# Altium integrated library all_in_one_library.IntLib: 677 symbols (part 3 of 3) (continued)
## RES_330k_5%_0805 (continued)
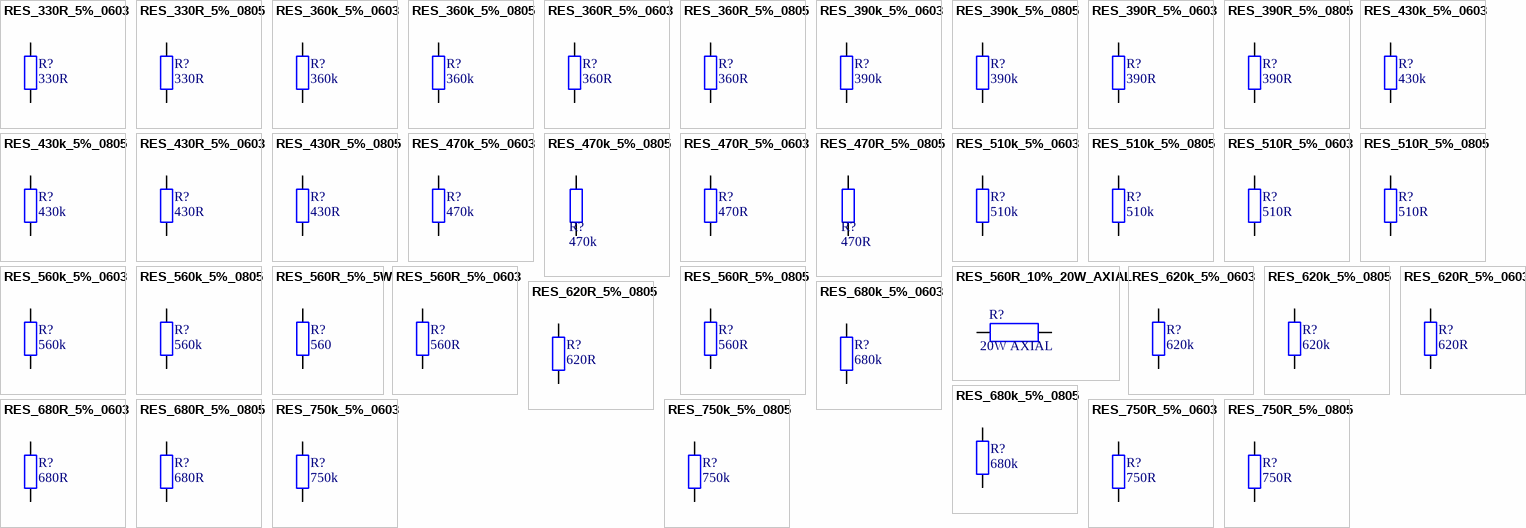
[diagram p15: symbols RES_330R_5%_0603 to RES_750R_5%_0805]

## RES_330R_5%_0603
designator R?, comment value 330R  (hidden comment: Thick film)
330.00; Tolerance [%]: ±5; Power Rating [W]: 0.1; Case [EIA]: 0603; Case [Metric]: 1608; Value [Ω]: 330.00
footprint RES_0603
pins: 1, 2
1 alternate drawing of the same symbol

## RES_330R_5%_0805
designator R?, comment value 330R  (hidden comment: Thick film)
330.00; Tolerance [%]: ±5; Power Rating [W]: 0.1; Case [EIA]: 0805; Case [Metric]: 2012; Value [Ω]: 330.00
footprint RES_0805
pins: 1, 2
1 alternate drawing of the same symbol

## RES_360k_5%_0603
designator R?, comment value 360k  (hidden comment: Thick film)
360000.00; Tolerance [%]: ±5; Power Rating [W]: 0.1; Case [EIA]: 0603; Case [Metric]: 1608; Value [Ω]: 360000.00
footprint RES_0603
pins: 1, 2
1 alternate drawing of the same symbol

## RES_360k_5%_0805
designator R?, comment value 360k  (hidden comment: Thick film)
360000.00; Tolerance [%]: ±5; Power Rating [W]: 0.1; Case [EIA]: 0805; Case [Metric]: 2012; Value [Ω]: 360000.00
footprint RES_0805
pins: 1, 2
1 alternate drawing of the same symbol

## RES_360R_5%_0603
designator R?, comment value 360R  (hidden comment: Thick film)
360.00; Tolerance [%]: ±5; Power Rating [W]: 0.1; Case [EIA]: 0603; Case [Metric]: 1608; Value [Ω]: 360.00
footprint RES_0603
pins: 1, 2
1 alternate drawing of the same symbol

## RES_360R_5%_0805
designator R?, comment value 360R  (hidden comment: Thick film)
360.00; Tolerance [%]: ±5; Power Rating [W]: 0.1; Case [EIA]: 0805; Case [Metric]: 2012; Value [Ω]: 360.00
footprint RES_0805
pins: 1, 2
1 alternate drawing of the same symbol

## RES_390k_5%_0603
designator R?, comment value 390k  (hidden comment: Thick film)
390000.00; Tolerance [%]: ±5; Power Rating [W]: 0.1; Case [EIA]: 0603; Case [Metric]: 1608; Value [Ω]: 390000.00
footprint RES_0603
pins: 1, 2
1 alternate drawing of the same symbol

## RES_390k_5%_0805
designator R?, comment value 390k  (hidden comment: Thick film)
390000.00; Tolerance [%]: ±5; Power Rating [W]: 0.1; Case [EIA]: 0805; Case [Metric]: 2012; Value [Ω]: 390000.00
footprint RES_0805
pins: 1, 2
1 alternate drawing of the same symbol

## RES_390R_5%_0603
designator R?, comment value 390R  (hidden comment: Thick film)
390.00; Tolerance [%]: ±5; Power Rating [W]: 0.1; Case [EIA]: 0603; Case [Metric]: 1608; Value [Ω]: 390.00
footprint RES_0603
pins: 1, 2
1 alternate drawing of the same symbol

## RES_390R_5%_0805
designator R?, comment value 390R  (hidden comment: Thick film)
390.00; Tolerance [%]: ±5; Power Rating [W]: 0.1; Case [EIA]: 0805; Case [Metric]: 2012; Value [Ω]: 390.00
footprint RES_0805
pins: 1, 2
1 alternate drawing of the same symbol

## RES_430k_5%_0603
designator R?, comment value 430k  (hidden comment: Thick film)
430000.00; Tolerance [%]: ±5; Power Rating [W]: 0.1; Case [EIA]: 0603; Case [Metric]: 1608; Value [Ω]: 430000.00
footprint RES_0603
pins: 1, 2
1 alternate drawing of the same symbol

## RES_430k_5%_0805
designator R?, comment value 430k  (hidden comment: Thick film)
430000.00; Tolerance [%]: ±5; Power Rating [W]: 0.1; Case [EIA]: 0805; Case [Metric]: 2012; Value [Ω]: 430000.00
footprint RES_0805
pins: 1, 2
1 alternate drawing of the same symbol

## RES_430R_5%_0603
designator R?, comment value 430R  (hidden comment: Thick film)
430.00; Tolerance [%]: ±5; Power Rating [W]: 0.1; Case [EIA]: 0603; Case [Metric]: 1608; Value [Ω]: 430.00
footprint RES_0603
pins: 1, 2
1 alternate drawing of the same symbol

## RES_430R_5%_0805
designator R?, comment value 430R  (hidden comment: Thick film)
430.00; Tolerance [%]: ±5; Power Rating [W]: 0.1; Case [EIA]: 0805; Case [Metric]: 2012; Value [Ω]: 430.00
footprint RES_0805
pins: 1, 2
1 alternate drawing of the same symbol

## RES_470k_5%_0603
designator R?, comment value 470k  (hidden comment: Thick film)
470000.00; Tolerance [%]: ±5; Power Rating [W]: 0.1; Case [EIA]: 0603; Case [Metric]: 1608; Value [Ω]: 470000.00
footprint RES_0603
pins: 1, 2
1 alternate drawing of the same symbol

## RES_470k_5%_0805
designator R?, comment value 470k  (hidden comment: Thick film)
470000.00; Tolerance [%]: ±5; Power Rating [W]: 0.1; Case [EIA]: 0805; Case [Metric]: 2012; Value [Ω]: 470000.00
footprint RES_0805
pins: 1, 2
1 alternate drawing of the same symbol

## RES_470R_5%_0603
designator R?, comment value 470R  (hidden comment: Thick film)
470.00; Tolerance [%]: ±5; Power Rating [W]: 0.1; Case [EIA]: 0603; Case [Metric]: 1608; Value [Ω]: 470.00
footprint RES_0603
pins: 1, 2
1 alternate drawing of the same symbol

## RES_470R_5%_0805
designator R?, comment value 470R  (hidden comment: Thick film)
470.00; Tolerance [%]: ±5; Power Rating [W]: 0.1; Case [EIA]: 0805; Case [Metric]: 2012; Value [Ω]: 470.00
footprint RES_0805
pins: 1, 2
1 alternate drawing of the same symbol

## RES_510k_5%_0603
designator R?, comment value 510k  (hidden comment: Thick film)
510000.00; Tolerance [%]: ±5; Power Rating [W]: 0.1; Case [EIA]: 0603; Case [Metric]: 1608; Value [Ω]: 510000.00
footprint RES_0603
pins: 1, 2
1 alternate drawing of the same symbol

## RES_510k_5%_0805
designator R?, comment value 510k  (hidden comment: Thick film)
510000.00; Tolerance [%]: ±5; Power Rating [W]: 0.1; Case [EIA]: 0805; Case [Metric]: 2012; Value [Ω]: 510000.00
footprint RES_0805
pins: 1, 2
1 alternate drawing of the same symbol

## RES_510R_5%_0603
designator R?, comment value 510R  (hidden comment: Thick film)
510.00; Tolerance [%]: ±5; Power Rating [W]: 0.1; Case [EIA]: 0603; Case [Metric]: 1608; Value [Ω]: 510.00
footprint RES_0603
pins: 1, 2
1 alternate drawing of the same symbol

## RES_510R_5%_0805
designator R?, comment value 510R  (hidden comment: Thick film)
510.00; Tolerance [%]: ±5; Power Rating [W]: 0.1; Case [EIA]: 0805; Case [Metric]: 2012; Value [Ω]: 510.00
footprint RES_0805
pins: 1, 2
1 alternate drawing of the same symbol

## RES_560k_5%_0603
designator R?, comment value 560k  (hidden comment: Thick film)
560000.00; Tolerance [%]: ±5; Power Rating [W]: 0.1; Case [EIA]: 0603; Case [Metric]: 1608; Value [Ω]: 560000.00
footprint RES_0603
pins: 1, 2
1 alternate drawing of the same symbol

## RES_560k_5%_0805
designator R?, comment value 560k  (hidden comment: Thick film)
560000.00; Tolerance [%]: ±5; Power Rating [W]: 0.1; Case [EIA]: 0805; Case [Metric]: 2012; Value [Ω]: 560000.00
footprint RES_0805
pins: 1, 2
1 alternate drawing of the same symbol

## RES_560R_5%_5W
designator R?, comment value 560  (hidden comment: Metal oxid)
560; Value [Ω]: 560000.00; Power Rating [W]: 5; Case [EIA]: metaloxid
footprint RES SQP MO (standing metaloxid resistor)
pins: 1, 2
1 alternate drawing of the same symbol

## RES_560R_5%_0603
designator R?, comment value 560R  (hidden comment: Thick film)
560.00; Tolerance [%]: ±5; Power Rating [W]: 0.1; Case [EIA]: 0603; Case [Metric]: 1608; Value [Ω]: 560.00
footprint RES_0603
pins: 1, 2
1 alternate drawing of the same symbol

## RES_560R_5%_0805
designator R?, comment value 560R  (hidden comment: Thick film)
560.00; Tolerance [%]: ±5; Power Rating [W]: 0.1; Case [EIA]: 0805; Case [Metric]: 2012; Value [Ω]: 560.00
footprint RES_0805
pins: 1, 2
1 alternate drawing of the same symbol

## RES_560R_10%_20W_AXIAL
designator R?, comment 20W AXIAL
20W_AXIAL
footprint RES_AX20W
footprint RES_AX20W - standoffset
pins: 1, 2

## RES_620k_5%_0603
designator R?, comment value 620k  (hidden comment: Thick film)
620000.00; Tolerance [%]: ±5; Power Rating [W]: 0.1; Case [EIA]: 0603; Case [Metric]: 1608; Value [Ω]: 620000.00
footprint RES_0603
pins: 1, 2
1 alternate drawing of the same symbol

## RES_620k_5%_0805
designator R?, comment value 620k  (hidden comment: Thick film)
620000.00; Tolerance [%]: ±5; Power Rating [W]: 0.1; Case [EIA]: 0805; Case [Metric]: 2012; Value [Ω]: 620000.00
footprint RES_0805
pins: 1, 2
1 alternate drawing of the same symbol

## RES_620R_5%_0603
designator R?, comment value 620R  (hidden comment: Thick film)
620.00; Tolerance [%]: ±5; Power Rating [W]: 0.1; Case [EIA]: 0603; Case [Metric]: 1608; Value [Ω]: 620.00
footprint RES_0603
pins: 1, 2
1 alternate drawing of the same symbol

## RES_620R_5%_0805
designator R?, comment value 620R  (hidden comment: Thick film)
620.00; Tolerance [%]: ±5; Power Rating [W]: 0.1; Case [EIA]: 0805; Case [Metric]: 2012; Value [Ω]: 620.00
footprint RES_0805
pins: 1, 2
1 alternate drawing of the same symbol

## RES_680k_5%_0603
designator R?, comment value 680k  (hidden comment: Thick film)
680000.00; Tolerance [%]: ±5; Power Rating [W]: 0.1; Case [EIA]: 0603; Case [Metric]: 1608; Value [Ω]: 680000.00
footprint RES_0603
pins: 1, 2
1 alternate drawing of the same symbol

## RES_680k_5%_0805
designator R?, comment value 680k  (hidden comment: Thick film)
680000.00; Tolerance [%]: ±5; Power Rating [W]: 0.1; Case [EIA]: 0805; Case [Metric]: 2012; Value [Ω]: 680000.00
footprint RES_0805
pins: 1, 2
1 alternate drawing of the same symbol

## RES_680R_5%_0603
designator R?, comment value 680R  (hidden comment: Thick film)
680.00; Tolerance [%]: ±5; Power Rating [W]: 0.1; Case [EIA]: 0603; Case [Metric]: 1608; Value [Ω]: 680.00
footprint RES_0603
pins: 1, 2
1 alternate drawing of the same symbol

## RES_680R_5%_0805
designator R?, comment value 680R  (hidden comment: Thick film)
680.00; Tolerance [%]: ±5; Power Rating [W]: 0.1; Case [EIA]: 0805; Case [Metric]: 2012; Value [Ω]: 680.00
footprint RES_0805
pins: 1, 2
1 alternate drawing of the same symbol

## RES_750k_5%_0603
designator R?, comment value 750k  (hidden comment: Thick film)
750000.00; Tolerance [%]: ±5; Power Rating [W]: 0.1; Case [EIA]: 0603; Case [Metric]: 1608; Value [Ω]: 750000.00
footprint RES_0603
pins: 1, 2
1 alternate drawing of the same symbol

## RES_750k_5%_0805
designator R?, comment value 750k  (hidden comment: Thick film)
750000.00; Tolerance [%]: ±5; Power Rating [W]: 0.1; Case [EIA]: 0805; Case [Metric]: 2012; Value [Ω]: 750000.00
footprint RES_0805
pins: 1, 2
1 alternate drawing of the same symbol

## RES_750R_5%_0603
designator R?, comment value 750R  (hidden comment: Thick film)
750.00; Tolerance [%]: ±5; Power Rating [W]: 0.1; Case [EIA]: 0603; Case [Metric]: 1608; Value [Ω]: 750.00
footprint RES_0603
pins: 1, 2
1 alternate drawing of the same symbol

## RES_750R_5%_0805
designator R?, comment value 750R  (hidden comment: Thick film)
750.00; Tolerance [%]: ±5; Power Rating [W]: 0.1; Case [EIA]: 0805; Case [Metric]: 2012; Value [Ω]: 750.00
footprint RES_0805
pins: 1, 2
1 alternate drawing of the same symbol

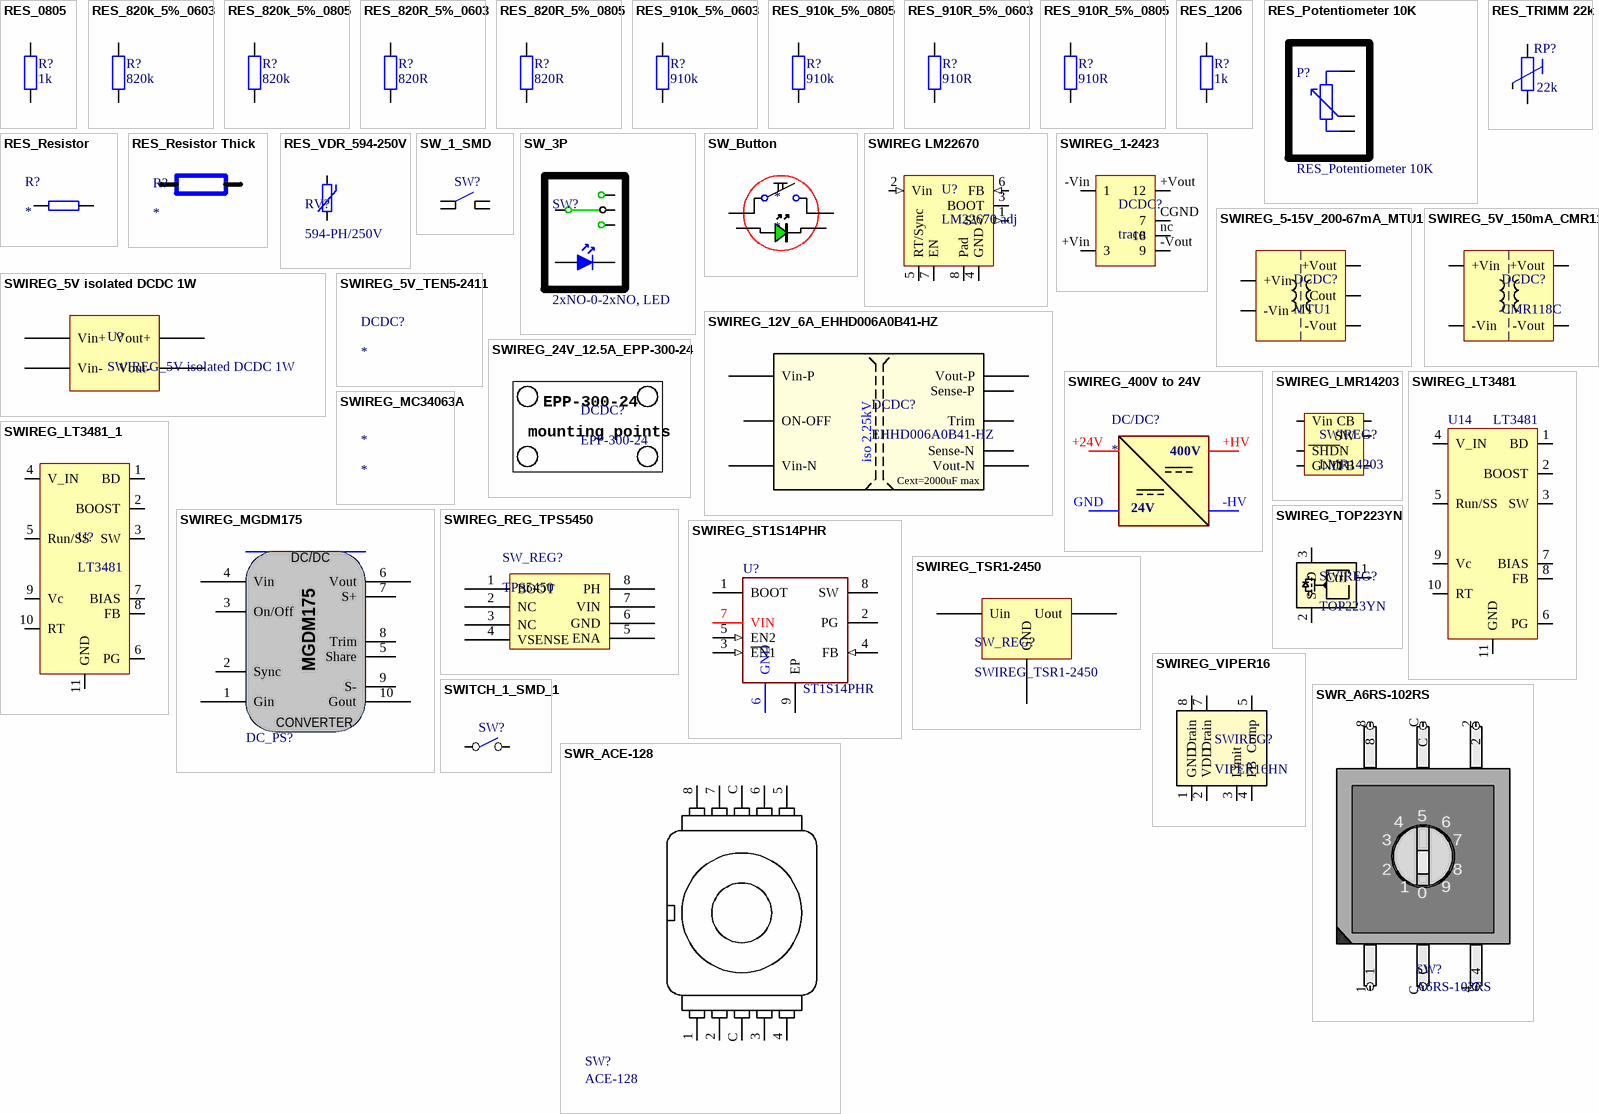
[diagram p16: symbols RES_0805 to SWR_ACE-128]

## RES_0805
designator R?, comment 1k
general resistor; Tolerance [%]: None; Power Rating [W]: 0.1; Case [EIA]: 1206; Case [Metric]: 3216; Value: 1k
footprint R0805
pins: 1, 2
1 alternate drawing of the same symbol

## RES_820k_5%_0603
designator R?, comment value 820k  (hidden comment: Thick film)
820000.00; Tolerance [%]: ±5; Power Rating [W]: 0.1; Case [EIA]: 0603; Case [Metric]: 1608; Value [Ω]: 820000.00
footprint RES_0603
pins: 1, 2
1 alternate drawing of the same symbol

## RES_820k_5%_0805
designator R?, comment value 820k  (hidden comment: Thick film)
820000.00; Tolerance [%]: ±5; Power Rating [W]: 0.1; Case [EIA]: 0805; Case [Metric]: 2012; Value [Ω]: 820000.00
footprint RES_0805
pins: 1, 2
1 alternate drawing of the same symbol

## RES_820R_5%_0603
designator R?, comment value 820R  (hidden comment: Thick film)
820.00; Tolerance [%]: ±5; Power Rating [W]: 0.1; Case [EIA]: 0603; Case [Metric]: 1608; Value [Ω]: 820.00
footprint RES_0603
pins: 1, 2
1 alternate drawing of the same symbol

## RES_820R_5%_0805
designator R?, comment value 820R  (hidden comment: Thick film)
820.00; Tolerance [%]: ±5; Power Rating [W]: 0.1; Case [EIA]: 0805; Case [Metric]: 2012; Value [Ω]: 820.00
footprint RES_0805
pins: 1, 2
1 alternate drawing of the same symbol

## RES_910k_5%_0603
designator R?, comment value 910k  (hidden comment: Thick film)
910000.00; Tolerance [%]: ±5; Power Rating [W]: 0.1; Case [EIA]: 0603; Case [Metric]: 1608; Value [Ω]: 910000.00
footprint RES_0603
pins: 1, 2
1 alternate drawing of the same symbol

## RES_910k_5%_0805
designator R?, comment value 910k  (hidden comment: Thick film)
910000.00; Tolerance [%]: ±5; Power Rating [W]: 0.1; Case [EIA]: 0805; Case [Metric]: 2012; Value [Ω]: 910000.00
footprint RES_0805
pins: 1, 2
1 alternate drawing of the same symbol

## RES_910R_5%_0603
designator R?, comment value 910R  (hidden comment: Thick film)
910.00; Tolerance [%]: ±5; Power Rating [W]: 0.1; Case [EIA]: 0603; Case [Metric]: 1608; Value [Ω]: 910.00
footprint RES_0603
pins: 1, 2
1 alternate drawing of the same symbol

## RES_910R_5%_0805
designator R?, comment value 910R  (hidden comment: Thick film)
910.00; Tolerance [%]: ±5; Power Rating [W]: 0.1; Case [EIA]: 0805; Case [Metric]: 2012; Value [Ω]: 910.00
footprint RES_0805
pins: 1, 2
1 alternate drawing of the same symbol

## RES_1206
designator R?, comment 1k
general resistor; Tolerance [%]: None; Power Rating [W]: 0.1; Case [EIA]: 1206; Case [Metric]: 3216; Value: 1k
footprint R1206
pins: 1, 2
1 alternate drawing of the same symbol

## RES_Potentiometer 10K
designator P?
Potentiometer 10K
pins: 1 POT1, 2 POT2, 3 POT3

## RES_Resistor
designator R?
pins: 1, 2

## RES_Resistor Thick
designator R?
pins: 1, 2

## RES_TRIMM 22k
designator RP?, comment 22k
BOURNS - 3296Y-1-223LF - TRIMMER, POT, 22KOHM, 10%, 25TURN, TH; Alias: BOURNS - 3296Y-1-223LF - TRIMMER 22k
footprint TRIMM 3296Y
pins: 1, 2, 3

## RES_VDR_594-250V
designator RV?, comment 594-PH/250V
varistor GME suplikove zasoby
footprint VAR_D7_E5 (roztec=5mm, priemer=8mm)
pins: 1, 2

## SW_1_SMD
designator SW?, comment Switch  (value not drawn)
TLACITKO_1
footprint SW_micro
pins: 1 COMMON, 2 COMMON, 3 NO, 4 NO

## SW_3P
designator SW?, comment 2xNO-0-2xNO, LED
pins: 1 NO11, 2 NO12, 3 NO13, 4 LED1, 5 LED2

## SW_Button
designator *
pins: 1, 2, 3, 4
1 alternate drawing of the same symbol

## SWIREG LM22670
designator U?, comment LM22670 adj
3A 4.2-42V stepdown switching regulator witch adjustable frequency; Suplier: Farnell; Alias: LM22670; Datasheet: http://www.farnell.com/datasheets/84969.pdf
footprint TO-263 (TJ7A)
pins: 1 SW (out), 2 Vin (in), 3 BOOT, 4 GND, 5 RT/Sync, 6 FB (in), 7 EN, 8 Pad

## SWIREG_1-2423
designator DCDC?, comment traco
24/+-15 tracopower
footprint TES 1-2423 (Traco 1W SMD)
pins: +Vin 3, +Vout 12, -Vin 1, -Vout 9, CGND 7, nc 18

## SWIREG_5-15V_200-67mA_MTU1
designator DCDC?, comment MTU1
Isolated 1W Single & Dual Output SM DC/DC Converter; Link: http://cz.farnell.com/webapp/wcs/stores/servlet/Search?st=MTU1&catalogId=15001&categoryId=700000004422&langId=420&storeId=10156
footprint MTU1_DCDC (murata iso power)
pins: +Vin, +Vout, -Vin, -Vout, Cout

## SWIREG_5V isolated DCDC 1W
designator U?
R1SE-0505; farnell: http://cz.farnell.com/recom-power/r1se-0505-r/dc-dc-converter-1x-o-p-0-2a-5v/dp/2218601
footprint R1SE-0505
pins: 1 Vin-, 2 Vin+, 4 Vout-, 5 Vout+

## SWIREG_5V_150mA_CMR118C
designator DCDC?, comment CMR118C
24V to 5V 150mA, 750 mW; Link: http://cz.farnell.com/murata-power-solutions/cmr118c/dc-dc-conv-iso-pol-1o-p-0-75w/dp/2400815
footprint DCDC_CMR118C (murata dcdc)
pins: +Vin, +Vout, -Vin, -Vout

## SWIREG_5V_TEN5-2411
designator DCDC?

## SWIREG_12V_6A_EHHD006A0B41-HZ
designator DCDC?, comment EHHD006A0B41-HZ
72W, 2kV isolated DCDC; link: http://cz.farnell.com/ge-critical-power/ehhd006a0b41-hz/dc-dc-12v-6a-1-8-brick-heat-plate/dp/2076849
footprint DCDC_1/8_Brick
pins: ON-OFF, S+ Sense-P, S- Sense-N, Trim, VI+ Vin-P, VI- Vin-N, Vo+ Vout-P, Vo- Vout-N
text: iso 2.25kV; Cext=2000uF max

## SWIREG_24V_12.5A_EPP-300-24
designator DCDC?, comment EPP-300-24
mounting parameters for EPP-300-24; link: http://goo.gl/zAbl2F
footprint EPP-300-24 (mounting for DCDC)
footprint EPP-300-24 - HP (High profile DCDC mounting)
footprint EPP-300-24 - LP (mounting for DCDC)
text: mounting points

## SWIREG_400V to 24V
designator DC/DC?
pins: +24V, +HV +400V, -HV +400V, GND +400V
text: 400V; 24V

## SWIREG_LMR14203
designator SWIREG?, comment LMR14203
SOT23-6 DC-DC BUCK 0.3A, 1.25MHZ; Link: http://cz.farnell.com/texas-instruments/lmr14203xmke-nopb/dc-dc-conv-buck-1-25mhz-sot-6/dp/2323516
footprint SOT23-6 (MAXIM package)
pins: 1 CB, 2 GND, 3 FB, 4 SHDN, 5 Vin, 6 SW

## SWIREG_LT3481
designator U14, comment LT3481
Swith step down
footprint LT-MSE-10 (for LT3481)
pins: 1 BD, 2 BOOST, 3 SW, 4 V_IN, 5 Run/SS, 6 PG, 7 BIAS, 8 FB, 9 Vc, 10 RT, 11 GND

## SWIREG_LT3481_1
designator U?, comment LT3481
Swith step down
pins: 1 BD, 2 BOOST, 3 SW, 4 V_IN, 5 Run/SS, 6 PG, 7 BIAS, 8 FB, 9 Vc, 10 RT, 11 GND

## SWIREG_MC34063A
designator *

## SWIREG_MGDM175
designator DC_PS?, comment CONVERTER  (value not drawn)
Hi-Rel DC/DC CONVERTER, 175W, Single output
footprint MGDM175
pins: 1 Gin, 2 Sync, 3 On/Off, 4 Vin, 5 Share, 6 Vout, 7 S+, 8 Trim, 9 S-, 10 Gout
text: DC/DC; MGDM175

## SWIREG_REG_TPS5450
designator SW_REG?, comment TPS5450
footprint TPS5450 - SO8_thermal (SOIC, 8-Leads, Body 4,90x3,90mm, Pitch 1,27mm, Thermal Pad 3,10x2,40mm, IPC Medium Density)
pins: 1 BOOT, 2 NC, 3 NC, 4 VSENSE, 5 ENA, 6 GND, 7 VIN, 8 PH

## SWIREG_ST1S14PHR
designator U?, comment ST1S14PHR
Up to 3 A step down switching regulator, 8-Pin HSOP; ComponentLink1Description: Manufacturer URL; PackageVersion: 2007; ComponentLink2URL: http://www.st.com/internet/com/TECHNICAL_RESOURCES/TECHNICAL_LITERATURE/DATASHEET/CD00285678.pdf; DatasheetVersion: Oct-2010; ComponentLink2Description: Datasheet; PackageReference: HSO-8; PackageDescription: 8-Pin Small Outline Integrated Circuit 1.27 mm Pitch; ComponentLink1URL: http://www.st.com
footprint SO8_Thermal
pins: 1 BOOT, 2 PG (oc), 3 ~{EN}1 (in), 4 FB (in), 5 EN2 (in), 6 GND (power), 7 VIN (power), 8 SW (power), 9 EP (power)

## SWIREG_TOP223YN
designator SWIREG?, comment TOP223YN
PWM SWITCH, TO-220-3; Link: http://www.tme.eu/cz/details/top223yn/stabilizator-napeti-obvody-dc-dc/power-integrations/#t73d087e2ca9b8c8ad0594216532a09b7
footprint TO220AB PWR
pins: 1 Ctrl, 2 S, 3 D

## SWIREG_TSR1-2450
designator SW_REG?
footprint TSR1 (Traco power)
pins: 1 Uin, 2 GND, 3 Uout

## SWIREG_VIPER16
designator SWIREG?, comment VIPER16HN
Fixed frequency VIPer; Link: http://cz.farnell.com/stmicroelectronics/viper16hn/ac-dc-converter-800v-115khz-7dip/dp/2311357
footprint DIP 8
pins: 1 GND, 2 VDD, 3 Limit, 4 FB, 5 Comp, 7 Drain, 8 Drain
1 alternate drawing of the same symbol

## SWITCH_1_SMD_1
designator SW?, comment Switch  (value not drawn)
TLACITKO_1
footprint SW_SMD
pins: 1 COMMON, 2 NO

## SWR_A6RS-102RS
designator SW?, comment A6RS-102RS
Omron Rotary DIP Switch
footprint SWR_A6RS-102RS (Omron Rotary DIP Switch)
pins: 1, 2, 4, 8, C, C
text: 5; 6; 3; 7; 9; 0

## SWR_ACE-128
designator SW?, comment ACE-128
footprint SWR_ACE-128
pins: 1, 2, 3, 4, 5, 6, 7, 8, C C , C C 

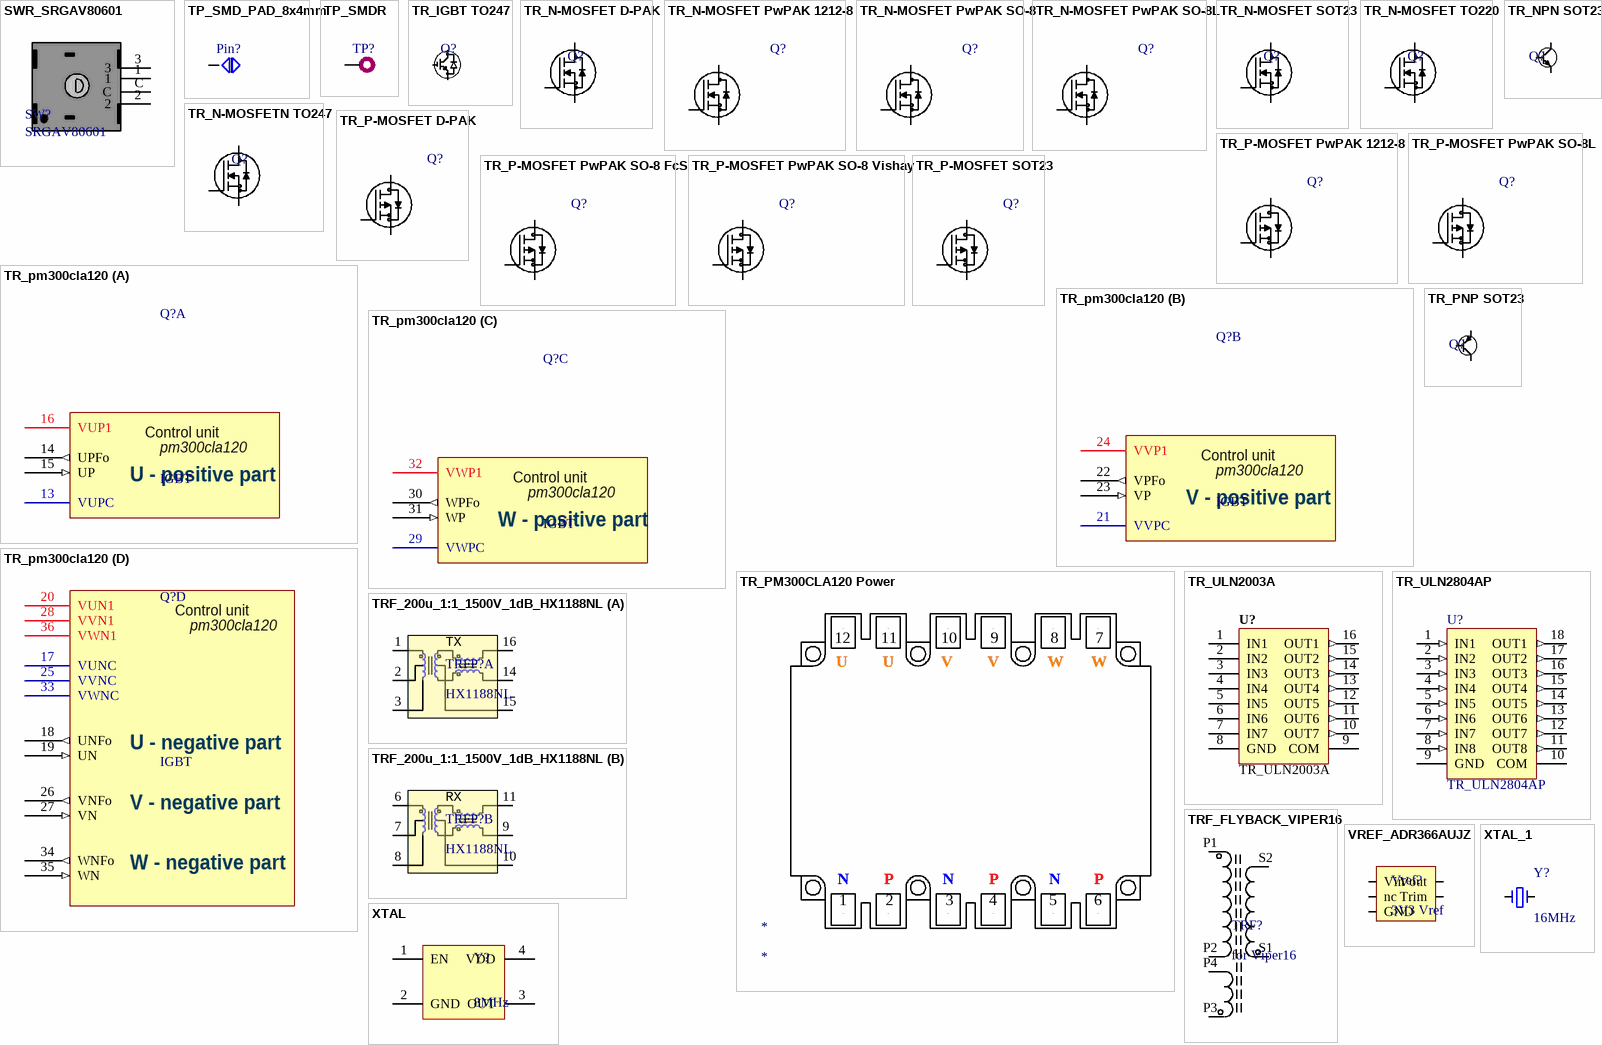
[diagram p17: symbols SWR_SRGAV80601 to XTAL_1]

## SWR_SRGAV80601
designator SW?, comment SRGAV80601
Hollow Shaft Encoder
footprint SWR_SRGAV80601 (Hollow Shaft Encoder)
pins: 1, 2, 3, C

## TP_SMD_PAD_8x4mm
designator Pin?, comment smd_pad  (value not drawn)
contact place for wire on pcb 8x4mm
footprint SMD_PAD_8_4_MM
pins: PIN

## TP_SMDR
designator TP?, comment TP-SMDR  (value not drawn)
smd round testpoint
footprint TP_ROUND (test-point)
pins: TP

## TR_IGBT TO247
designator Q?, comment igbt, diode  (value not drawn)
IGBT with diode tranzistor
footprint TO-247AC - Power (SIP with Mounting Hole; 3 Leads; Body 20 x 15.6 x 5 mm (typ); Pitch 5.45 mm)
pins: 1 G, 2 C, 3 E

## TR_N-MOSFET D-PAK
designator Q?, comment Nmos  (value not drawn)
TO252
footprint D-PAK
footprint D-PAK_HV (S-D higher isolation gap)
pins: 1 G, 2 S, 3 D

## TR_N-MOSFET PwPAK 1212-8
designator Q?, comment SiSA18ADN  (value not drawn)
nmos 30V 38A 6mR; Alias: SISA18ADN-T1-GE3
footprint POWERPAK_1212-8
pins: D, G, S

## TR_N-MOSFET PwPAK SO-8
designator Q?, comment SiR864DP  (value not drawn)
nmos 30V 40A 3mR; Alias: SIR864DP-T1-GE3
footprint PowerPAK_SO-8_single
pins: D, G, S

## TR_N-MOSFET PwPAK SO-8L
designator Q?, comment SQJ422EP  (value not drawn)
nmos PwPAK SO-8L; Alias: SQJ422EP
pins: D, G, S

## TR_N-MOSFET SOT23
designator Q?, comment Nmos  (value not drawn)
footprint SOT23m
pins: 1 G, 2 S, 3 D

## TR_N-MOSFET TO220
designator Q?, comment Nmos  (value not drawn)
footprint TO220AB
footprint TO220AB PWR
pins: 1 G, 2 D, 3 S

## TR_N-MOSFETN TO247
designator Q?, comment Nmos  (value not drawn)
footprint TO-247AC PWR (SIP with Mounting Hole; 3 Leads; Body 20 x 15.6 x 5 mm (typ); Pitch 5.45 mm); pin to pad D>2 G>1 S>3
footprint TO-247AC (SIP with Mounting Hole; 3 Leads; Body 20 x 15.6 x 5 mm (typ); Pitch 5.45 mm); pin to pad D>2 G>1 S>3
pins: D, G, S

## TR_NPN SOT23
designator Q?, comment BC817  (value not drawn)
BC817 apod.; Alias: BC817
footprint SOT23m
pins: 1 B, 2 E, 3 C

## TR_P-MOSFET D-PAK
designator Q?, comment NTD2955G  (value not drawn)
pmos dpak to252; Alias: NTD2955G
footprint D-PAK
footprint D-PAK_HV (S-D higher isolation gap)
pins: 1 G, 2 S, 3 D

## TR_P-MOSFET PwPAK 1212-8
designator Q?, comment SI7101DN  (value not drawn)
pmos 30V 35A 6mR; Alias: SI7101DN-T1-GE3
footprint POWERPAK_1212-8
pins: D, G, S

## TR_P-MOSFET PwPAK SO-8 FcS
designator Q?, comment FDMS6681Z  (value not drawn)
pmos 30V 49A 2.7mR; Alias: FDMS6681Z
footprint PowerPAK_SO-8_single
pins: D, G, S

## TR_P-MOSFET PwPAK SO-8 Vishay
designator Q?, comment SI7149DP  (value not drawn)
pmos 30V 50A 4.2mR; Alias: SI7149DP-T1-GE3
footprint PowerPAK_SO-8_single
pins: D, G, S

## TR_P-MOSFET PwPAK SO-8L
designator Q?, comment SQJ422EP  (value not drawn)
pmos PwPAK SO-8L; Alias: SQJ422EP
pins: D, G, S

## TR_P-MOSFET SOT23
designator Q?, comment AP2309GN-HF-3TR  (value not drawn)
MOSFET, PCH, -30V, 75MOHM, SOT-23; Alias: AP2309GN-HF-3TR
footprint SOT23m
pins: 1 G, 2 S, 3 D

## TR_pm300cla120
designator Q?, comment IGBT
Switching unit FSE02
footprint PM300RLA060
part A pins: 13 VUPC, 14 UPFo (out), 15 UP (in), 16 VUP1
part B pins: 21 VVPC, 22 VPFo (out), 23 VP (in), 24 VVP1
part C pins: 29 VWPC, 30 WPFo (out), 31 WP (in), 32 VWP1
part D pins: 17 VUNC, 18 UNFo (out), 19 UN (in), 20 VUN1, 25 VVNC, 26 VNFo (out), 27 VN (in), 28 VVN1, 33 VWNC, 34 WNFo (out), 35 WN (in), 36 VWN1
part A text: Control unit; pm300cla120; U - positive part
part B text: Control unit; pm300cla120; V - positive part
part C text: Control unit; pm300cla120; W - positive part
part D text: Control unit; pm300cla120; U - negative part; V - negative part; W - negative part

## TR_PM300CLA120 Power
designator *
pins: 3 N, 4 N, 4 N, 4 N, 4 N, 4 N, 4 N, 5 N, 5 N, 5 N, 5 N, 5 N
text: 12; 11; 10; 9; 8; 7; U; V; W; P; 1; 2; 6

## TR_PNP SOT23
designator Q?, comment BC807  (value not drawn)
BC807 apod.; Alias: BC807
footprint SOT23m
pins: 1 B, 2 E, 3 C

## TR_ULN2003A
designator U?
Seven darlington arrays
footprint so16
pins: 1 IN1, 2 IN2, 3 IN3, 4 IN4, 5 IN5, 6 IN6, 7 IN7, 8 GND (power), 9 COM (power), 10 OUT7 (out), 11 OUT6 (out), 12 OUT5 (out), 13 OUT4 (out), 14 OUT3 (out), 15 OUT2 (out), 16 OUT1 (out)

## TR_ULN2804AP
designator U?
8 darlington arrays; Alias: ULN2804AP
footprint SOic18
pins: 1 IN1 (in), 2 IN2 (in), 3 IN3 (in), 4 IN4 (in), 5 IN5 (in), 6 IN6 (in), 7 IN7 (in), 8 IN8 (in), 9 GND (power), 10 COM (power), 11 OUT8 (out), 12 OUT7 (out), 13 OUT6 (out), 14 OUT5 (out), 15 OUT4 (out), 16 OUT3 (out), 17 OUT2 (out), 18 OUT1 (out)

## TRF_200u_1:1_1500V_1dB_HX1188NL
designator TRFP?, comment HX1188NL
pulse isolation transformer 100k-100Mb; Link: http://www.tme.eu/cz/details/hx1188nl/smd-tlumivky/pulse/
footprint HX1188NL (pulse transformer body)
part A pins: 1, 2, 3, 14, 15, 16
part B pins: 6, 7, 8, 9, 10, 11
part A text: TX
part B text: RX

## TRF_FLYBACK_VIPER16
designator TRF?, comment for Viper16
Flyback transformer
footprint EE20-5-5 (transformer footprint)
pins: P1, P2, P3, P4, S1, S2

## VREF_ADR366AUJZ
designator Vref?, comment 3V3 Vref
3V3 +-8mV voltage reference, 25mA, trim; Link: http://cz.farnell.com/analog-devices/adr366aujz-reel7/ic-sm-volt-ref-sink-source/dp/1117857
footprint SOT23-5 (MAXIM package)
pins: 1 nc, 2 GND, 3 Vin, 4 Vout, 5 Trim

## XTAL
designator Y?, comment 8MHz
Crystal_oscillator; farnell: http://cz.farnell.com/txc/7c-8-000mbb-t/osc-8-000mhz-3-3v-smd-5-0x3-2/dp/1842054
footprint XTAL
pins: 1 EN, 2 GND, 3 OUT, 4 VDD

## XTAL_1
designator Y?, comment 16MHz
KRYSTAL
footprint HC49/U
footprint XTAL_2MM
pins: 1, 2